# Altium schematic symbol library altera.SCHLIB: 68 symbols (part 5 of 6) (continued)
## EPF6016-P208
designator IC?, comment EPF6016   FLEX 6000 family
MPN: EPF6016AQC208-3N; OC_FARNELL: 1549398; OC_NEWARK: 51R9156
footprint PQFP208
part A pins: 6 !CE, 24 GCLK1, 28 GCLK2, 46 MSEL, 77 !CONFIG, 80 !STATUS, 128 GCLK3, 132 GCLK4, 150 CONF_DONE, 181 DATA0, 184 DCLK
part B pins: 9 VCCIO (power)
part C pins: 27 VCCIO (power)
part D pins: 45 VCCIO (power)
part E pins: 63 VCCIO (power)
part F pins: 79 VCCIO (power)
part G pins: 96 VCCIO (power)
part H pins: 112 VCCIO (power)
part I pins: 131 VCCIO (power)
part J pins: 149 VCCIO (power)
part K pins: 166 VCCIO (power)
part L pins: 183 VCCIO (power)
part M pins: 200 VCCIO (power)
part N pins: 7 GND (power)
part O pins: 25 GND (power)
part P pins: 43 GND (power)
part Q pins: 62 GND (power)
part R pins: 78 GND (power)
part S pins: 95 GND (power)
part T pins: 110 GND (power)
part U pins: 129 GND (power)
part V pins: 147 GND (power)
part W pins: 165 GND (power)
part X pins: 182 GND (power)
part Y pins: 199 GND (power)
part Z pins: 1 IOA1, 2 IOA3, 3 IOA4, 153 IOA6, 154 IOA7, 155 IOA8, 156 IOA9, 157 IOA11, 158 IOA12, 159 IOA13, 160 IOA14, 205 IOA15, 206 IOA16, 207 IOA17, 208 IOA18
part 27 pins: 16 IOC1, 17 IOC2, 18 IOC3, 19 IOC4, 20 IOC5, 21 IOC6, 22 IOC7, 23 IOC8, 133 IOC10, 134 IOC11, 135 IOC12, 136 IOC13, 137 IOC14, 138 IOC16, 139 IOC17, 140 IOC18
part 28 pins: 29 IOD1, 30 IOD3, 31 IOD4, 32 IOD5, 33 IOD6, 34 IOD7, 35 IOD8, 36 IOD9, 120 IOD11, 121 IOD12, 122 IOD13, 123 IOD14, 124 IOD15, 125 IOD16, 126 IOD17, 127 IOD18
part 29 pins: 37 IOE2, 38 IOE3, 39 IOE4, 40 IOE5, 41 IOE6, 42 IOE7, 47 IOE9, 108 IOE11, 109 IOE12, 113 IOE13, 114 IOE14, 115 IOE15, 116 IOE16, 117 IOE17, 118 IOE18, 119 IOE19
part 30 pins: 48 IOF1, 49 IOF2, 50 IOF3, 51 IOF4, 52 IOF5, 53 IOF7, 54 IOF8, 55 IOF9, 56 IOF10, 101 IOF11, 102 IOF12, 103 IOF13, 104 IOF14, 105 IOF15, 106 IOF17, 107 IOF18
part 31 pins: 57 IO11, 58 IO21, 59 IO22, 60 IO31, 61 IO32, 64 IO41, 65 IO51, 66 IO52, 195 IO53, 196 IO54, 197 IO43, 198 IO44, 201 IO34, 202 IO23, 203 IO24, 204 IO12
part 32 pins: 67 IO61, 68 IO71, 69 IO72, 70 IO81, 71 IO82, 72 IO91, 188 IO93, 189 IO94, 190 IO83, 191 IO73, 192 IO74, 193 IO63, 194 IO64
part 33 pins: 73 IO101, 74 IO102, 75 IO111, 76 IO112, 81 IO121, 82 IO122, 83 IO132, 178 IO133, 179 IO134, 180 IO123, 185 IO113, 186 IO114, 187 IO104
part 34 pins: 84 IO141, 85 IO142, 86 IO151, 87 IO152, 88 IO161, 89 IO162, 90 IO172, 171 IO173, 172 IO174, 173 IO163, 174 IO164, 175 IO153, 176 IO154, 177 IO143
part 35 pins: 91 IO181, 92 IO182, 93 IO191, 94 IO192, 97 IO202, 98 IO211, 99 IO212, 100 IO221, 161 IO222, 162 IO214, 163 IO203, 164 IO204, 167 IO193, 168 IO194, 169 IO183, 170 IO184
part 36 pins: 4 IOB1, 5 IOB2, 10 IOB4, 11 IOB5, 12 IOB6, 13 IOB7, 14 IOB8, 15 IOB9, 141 IOB10, 142 IOB11, 143 IOB12, 144 IOB14, 145 IOB15, 146 IOB16, 151 IOB17, 152 IOB18
part 37 pins: 8 VCC (power)
part 38 pins: 26 VCC (power)
part 39 pins: 44 VCC (power)
part 40 pins: 111 VCC (power)
part 41 pins: 130 VCC (power)
part 42 pins: 148 VCC (power)

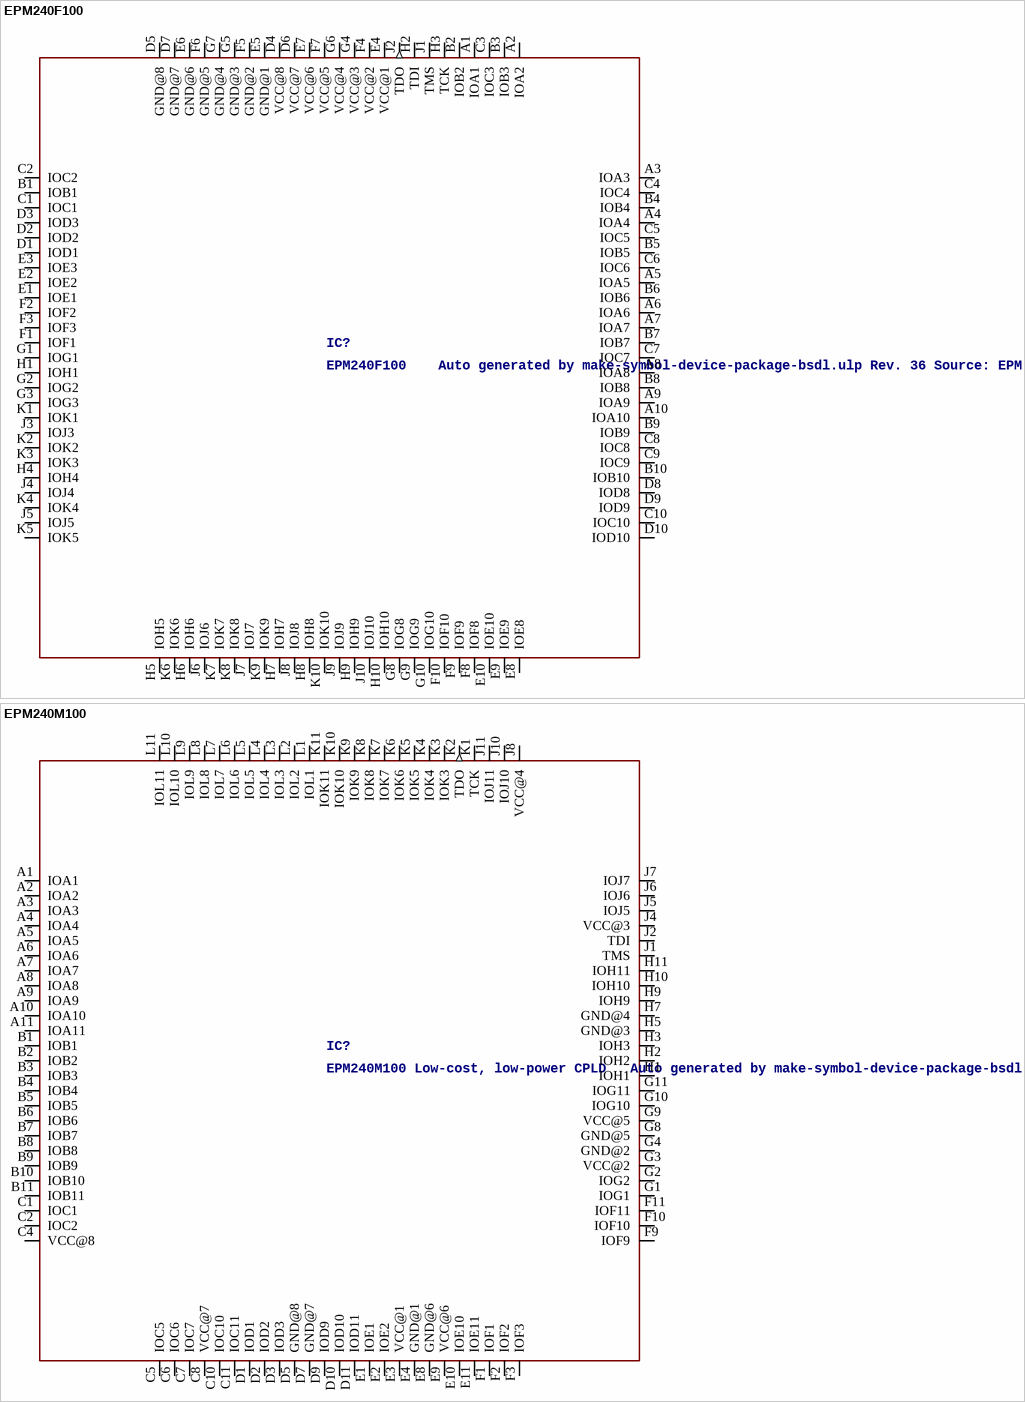
[diagram p39: symbols EPM240F100 to EPM240M100]

## EPM240F100
designator IC?, comment EPM240F100    Auto generated by make-symbol-device-package-bsdl.ulp Rev. 36 Source: EPM240F100.BSD
MPN: SA800-B293; OC_FARNELL: 1635094; OC_NEWARK: 74R0178
footprint FBGA100
pins: A1 IOA1, A2 IOA2, A3 IOA3, A4 IOA4, A5 IOA5, A6 IOA6, A7 IOA7, A8 IOA8, A9 IOA9, A10 IOA10, B1 IOB1, B2 IOB2, B3 IOB3, B4 IOB4, B5 IOB5, B6 IOB6, B7 IOB7, B8 IOB8, B9 IOB9, B10 IOB10, C1 IOC1, C2 IOC2, C3 IOC3, C4 IOC4, C5 IOC5, C6 IOC6, C7 IOC7, C8 IOC8, C9 IOC9, C10 IOC10, D1 IOD1, D2 IOD2, D3 IOD3, D4 VCC@8 (power), D5 GND@8 (power), D6 VCC@7 (power), D7 GND@7 (power), D8 IOD8, D9 IOD9, D10 IOD10, E1 IOE1, E2 IOE2, E3 IOE3, E4 VCC@1 (power), E5 GND@1 (power), E6 GND@6 (power), E7 VCC@6 (power), E8 IOE8, E9 IOE9, E10 IOE10, F1 IOF1, F2 IOF2, F3 IOF3, F4 VCC@2 (power), F5 GND@2 (power), F6 GND@5 (power), F7 VCC@5 (power), F8 IOF8, F9 IOF9, F10 IOF10, G1 IOG1, G2 IOG2, G3 IOG3, G4 VCC@3 (power), G5 GND@3 (power), G6 VCC@4 (power), G7 GND@4 (power), G8 IOG8, G9 IOG9, G10 IOG10, H1 IOH1, H2 TDI, H3 TCK, H4 IOH4, H5 IOH5, H6 IOH6, H7 IOH7, H8 IOH8, H9 IOH9, H10 IOH10, J1 TMS, J2 TDO (out), J3 IOJ3, J4 IOJ4, J5 IOJ5, J6 IOJ6, J7 IOJ7, J8 IOJ8, J9 IOJ9, J10 IOJ10, K1 IOK1, K2 IOK2, K3 IOK3, K4 IOK4, K5 IOK5, K6 IOK6, K7 IOK7, K8 IOK8, K9 IOK9, K10 IOK10

## EPM240M100
designator IC?, comment EPM240M100 Low-cost, low-power CPLD   Auto generated by make-symbol-device-package-bsdl.ulp Rev. 36 Source: EPM240M100.BSD
MPN: EPM240M100C4N; OC_FARNELL: 1635095; OC_NEWARK: 51R0493
footprint MBGA100
pins: A1 IOA1, A2 IOA2, A3 IOA3, A4 IOA4, A5 IOA5, A6 IOA6, A7 IOA7, A8 IOA8, A9 IOA9, A10 IOA10, A11 IOA11, B1 IOB1, B2 IOB2, B3 IOB3, B4 IOB4, B5 IOB5, B6 IOB6, B7 IOB7, B8 IOB8, B9 IOB9, B10 IOB10, B11 IOB11, C1 IOC1, C2 IOC2, C4 VCC@8 (power), C5 IOC5, C6 IOC6, C7 IOC7, C8 VCC@7 (power), C10 IOC10, C11 IOC11, D1 IOD1, D2 IOD2, D3 IOD3, D5 GND@8 (power), D7 GND@7 (power), D9 IOD9, D10 IOD10, D11 IOD11, E1 IOE1, E2 IOE2, E3 VCC@1 (power), E4 GND@1 (power), E8 GND@6 (power), E9 VCC@6 (power), E10 IOE10, E11 IOE11, F1 IOF1, F2 IOF2, F3 IOF3, F9 IOF9, F10 IOF10, F11 IOF11, G1 IOG1, G2 IOG2, G3 VCC@2 (power), G4 GND@2 (power), G8 GND@5 (power), G9 VCC@5 (power), G10 IOG10, G11 IOG11, H1 IOH1, H2 IOH2, H3 IOH3, H5 GND@3 (power), H7 GND@4 (power), H9 IOH9, H10 IOH10, H11 IOH11, J1 TMS, J2 TDI, J4 VCC@3 (power), J5 IOJ5, J6 IOJ6, J7 IOJ7, J8 VCC@4 (power), J10 IOJ10, J11 IOJ11, K1 TCK, K2 TDO (out), K3 IOK3, K4 IOK4, K5 IOK5, K6 IOK6, K7 IOK7, K8 IOK8, K9 IOK9, K10 IOK10, K11 IOK11, L1 IOL1, L2 IOL2, L3 IOL3, L4 IOL4, L5 IOL5, L6 IOL6, L7 IOL7, L8 IOL8, L9 IOL9, L10 IOL10, L11 IOL11

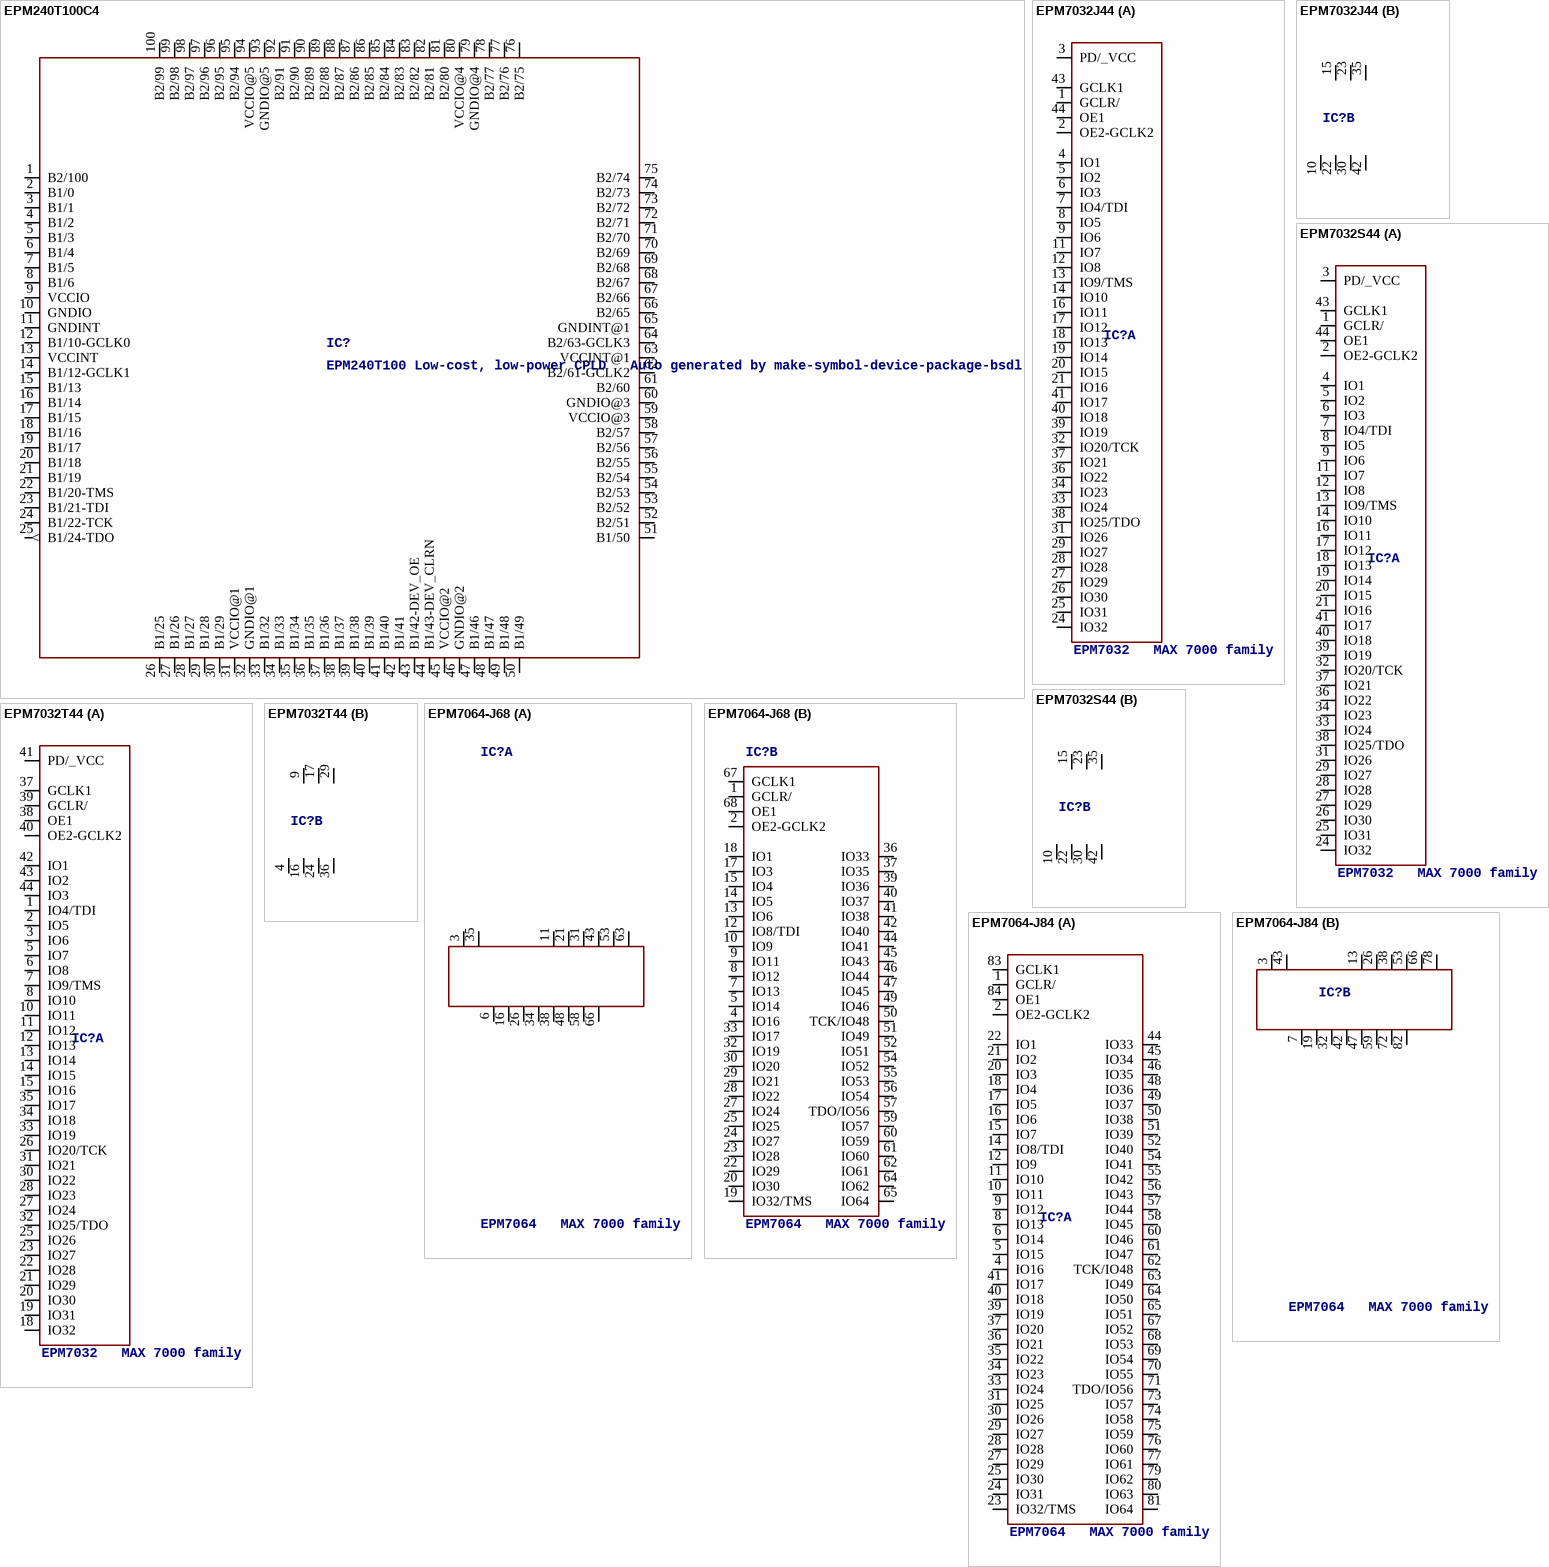
[diagram p40: symbols EPM240T100C4 to EPM7064-J84]

## EPM240T100C4
designator IC?, comment EPM240T100 Low-cost, low-power CPLD   Auto generated by make-symbol-device-package-bsdl.ulp Rev. 35 Source: www.altera.com .. epm240-io.txt
MPN: EPM240T100C4; OC_FARNELL: 1453502; OC_NEWARK: 51R9357
footprint TQFP100
pins: 1 B2/100, 2 B1/0, 3 B1/1, 4 B1/2, 5 B1/3, 6 B1/4, 7 B1/5, 8 B1/6, 9 VCCIO (power), 10 GNDIO (power), 11 GNDINT (power), 12 B1/10-GCLK0, 13 VCCINT (power), 14 B1/12-GCLK1, 15 B1/13, 16 B1/14, 17 B1/15, 18 B1/16, 19 B1/17, 20 B1/18, 21 B1/19, 22 B1/20-TMS, 23 B1/21-TDI, 24 B1/22-TCK, 25 B1/24-TDO (out), 26 B1/25, 27 B1/26, 28 B1/27, 29 B1/28, 30 B1/29, 31 VCCIO@1 (power), 32 GNDIO@1 (power), 33 B1/32, 34 B1/33, 35 B1/34, 36 B1/35, 37 B1/36, 38 B1/37, 39 B1/38, 40 B1/39, 41 B1/40, 42 B1/41, 43 B1/42-DEV_OE, 44 B1/43-DEV_CLRN, 45 VCCIO@2 (power), 46 GNDIO@2 (power), 47 B1/46, 48 B1/47, 49 B1/48, 50 B1/49, 51 B1/50, 52 B2/51, 53 B2/52, 54 B2/53, 55 B2/54, 56 B2/55, 57 B2/56, 58 B2/57, 59 VCCIO@3 (power), 60 GNDIO@3 (power), 61 B2/60, 62 B2/61-GCLK2, 63 VCCINT@1 (power), 64 B2/63-GCLK3, 65 GNDINT@1 (power), 66 B2/65, 67 B2/66, 68 B2/67, 69 B2/68, 70 B2/69, 71 B2/70, 72 B2/71, 73 B2/72, 74 B2/73, 75 B2/74, 76 B2/75, 77 B2/76, 78 B2/77, 79 GNDIO@4 (power), 80 VCCIO@4 (power), 81 B2/80, 82 B2/81, 83 B2/82, 84 B2/83, 85 B2/84, 86 B2/85, 87 B2/86, 88 B2/87, 89 B2/88, 90 B2/89, 91 B2/90, 92 B2/91, 93 GNDIO@5 (power), 94 VCCIO@5 (power), 95 B2/94, 96 B2/95, 97 B2/96, 98 B2/97, 99 B2/98, 100 B2/99

## EPM7032J44
designator IC?, comment EPM7032   MAX 7000 family
OC_FARNELL: unknown; OC_NEWARK: unknown
footprint PLCC44
part A pins: 1 GCLR/, 2 OE2-GCLK2, 3 PD/_VCC, 4 IO1, 5 IO2, 6 IO3, 7 IO4/TDI, 8 IO5, 9 IO6, 11 IO7, 12 IO8, 13 IO9/TMS, 14 IO10, 16 IO11, 17 IO12, 18 IO13, 19 IO14, 20 IO15, 21 IO16, 24 IO32, 25 IO31, 26 IO30, 27 IO29, 28 IO28, 29 IO27, 31 IO26, 32 IO20/TCK, 33 IO24, 34 IO23, 36 IO22, 37 IO21, 38 IO25/TDO, 39 IO19, 40 IO18, 41 IO17, 43 GCLK1, 44 OE1
part B pins: 10 GND (power), 15 VCC (power), 22 GND@1 (power), 23 VCC@1 (power), 30 GND@2 (power), 35 VCC@2 (power), 42 GND@3 (power)

## EPM7032S44
designator IC?, comment EPM7032   MAX 7000 family
MPN: EPM7032SLC44-6N; OC_FARNELL: 1549447; OC_NEWARK: 51R9532
footprint PLCC-S44
part A pins: 1 GCLR/, 2 OE2-GCLK2, 3 PD/_VCC, 4 IO1, 5 IO2, 6 IO3, 7 IO4/TDI, 8 IO5, 9 IO6, 11 IO7, 12 IO8, 13 IO9/TMS, 14 IO10, 16 IO11, 17 IO12, 18 IO13, 19 IO14, 20 IO15, 21 IO16, 24 IO32, 25 IO31, 26 IO30, 27 IO29, 28 IO28, 29 IO27, 31 IO26, 32 IO20/TCK, 33 IO24, 34 IO23, 36 IO22, 37 IO21, 38 IO25/TDO, 39 IO19, 40 IO18, 41 IO17, 43 GCLK1, 44 OE1
part B pins: 10 GND (power), 15 VCC (power), 22 GND@1 (power), 23 VCC@1 (power), 30 GND@2 (power), 35 VCC@2 (power), 42 GND@3 (power)

## EPM7032T44
designator IC?, comment EPM7032   MAX 7000 family
MPN: EPM7032SLC44-6N; OC_FARNELL: 1549447; OC_NEWARK: 51R9532
footprint TQFP44
part A pins: 1 IO4/TDI, 2 IO5, 3 IO6, 5 IO7, 6 IO8, 7 IO9/TMS, 8 IO10, 10 IO11, 11 IO12, 12 IO13, 13 IO14, 14 IO15, 15 IO16, 18 IO32, 19 IO31, 20 IO30, 21 IO29, 22 IO28, 23 IO27, 25 IO26, 26 IO20/TCK, 27 IO24, 28 IO23, 30 IO22, 31 IO21, 32 IO25/TDO, 33 IO19, 34 IO18, 35 IO17, 37 GCLK1, 38 OE1, 39 GCLR/, 40 OE2-GCLK2, 41 PD/_VCC, 42 IO1, 43 IO2, 44 IO3
part B pins: 4 GND (power), 9 VCC (power), 16 GND@1 (power), 17 VCC@1 (power), 24 GND@2 (power), 29 VCC@2 (power), 36 GND@3 (power)

## EPM7064-J68
designator IC?, comment EPM7064   MAX 7000 family
OC_FARNELL: unknown; OC_NEWARK: unknown
footprint PLCC68
part A pins: 3 VCC (power), 6 GND (power), 11 VCCIO (power), 16 GND@1 (power), 21 VCCIO@1 (power), 26 GND@2 (power), 31 VCCIO@2 (power), 34 GND@3 (power), 35 VCC@1 (power), 38 GND@4 (power), 43 VCCIO@3 (power), 48 GND@5 (power), 53 VCCIO@4 (power), 58 GND@6 (power), 63 VCCIO@5 (power), 66 GND@7 (power)
part B pins: 1 GCLR/, 2 OE2-GCLK2, 4 IO16, 5 IO14, 7 IO13, 8 IO12, 9 IO11, 10 IO9, 12 IO8/TDI, 13 IO6, 14 IO5, 15 IO4, 17 IO3, 18 IO1, 19 IO32/TMS, 20 IO30, 22 IO29, 23 IO28, 24 IO27, 25 IO25, 27 IO24, 28 IO22, 29 IO21, 30 IO20, 32 IO19, 33 IO17, 36 IO33, 37 IO35, 39 IO36, 40 IO37, 41 IO38, 42 IO40, 44 IO41, 45 IO43, 46 IO44, 47 IO45, 49 IO46, 50 TCK/IO48, 51 IO49, 52 IO51, 54 IO52, 55 IO53, 56 IO54, 57 TDO/IO56, 59 IO57, 60 IO59, 61 IO60, 62 IO61, 64 IO62, 65 IO64, 67 GCLK1, 68 OE1

## EPM7064-J84
designator IC?, comment EPM7064   MAX 7000 family
MPN: EPM7064SLC84-10N; OC_FARNELL: 1549457; OC_NEWARK: 51R9623
footprint PLCC84
part A pins: 1 GCLR/, 2 OE2-GCLK2, 4 IO16, 5 IO15, 6 IO14, 8 IO13, 9 IO12, 10 IO11, 11 IO10, 12 IO9, 14 IO8/TDI, 15 IO7, 16 IO6, 17 IO5, 18 IO4, 20 IO3, 21 IO2, 22 IO1, 23 IO32/TMS, 24 IO31, 25 IO30, 27 IO29, 28 IO28, 29 IO27, 30 IO26, 31 IO25, 33 IO24, 34 IO23, 35 IO22, 36 IO21, 37 IO20, 39 IO19, 40 IO18, 41 IO17, 44 IO33, 45 IO34, 46 IO35, 48 IO36, 49 IO37, 50 IO38, 51 IO39, 52 IO40, 54 IO41, 55 IO42, 56 IO43, 57 IO44, 58 IO45, 60 IO46, 61 IO47, 62 TCK/IO48, 63 IO49, 64 IO50, 65 IO51, 67 IO52, 68 IO53, 69 IO54, 70 IO55, 71 TDO/IO56, 73 IO57, 74 IO58, 75 IO59, 76 IO60, 77 IO61, 79 IO62, 80 IO63, 81 IO64, 83 GCLK1, 84 OE1
part B pins: 3 VCC (power), 7 GND (power), 13 VCCIO (power), 19 GND@1 (power), 26 VCCIO@1 (power), 32 GND@2 (power), 38 VCCIO@2 (power), 42 GND@3 (power), 43 VCC@1 (power), 47 GND@4 (power), 53 VCCIO@3 (power), 59 GND@5 (power), 66 VCCIO@4 (power), 72 GND@6 (power), 78 VCCIO@5 (power), 82 GND@7 (power)

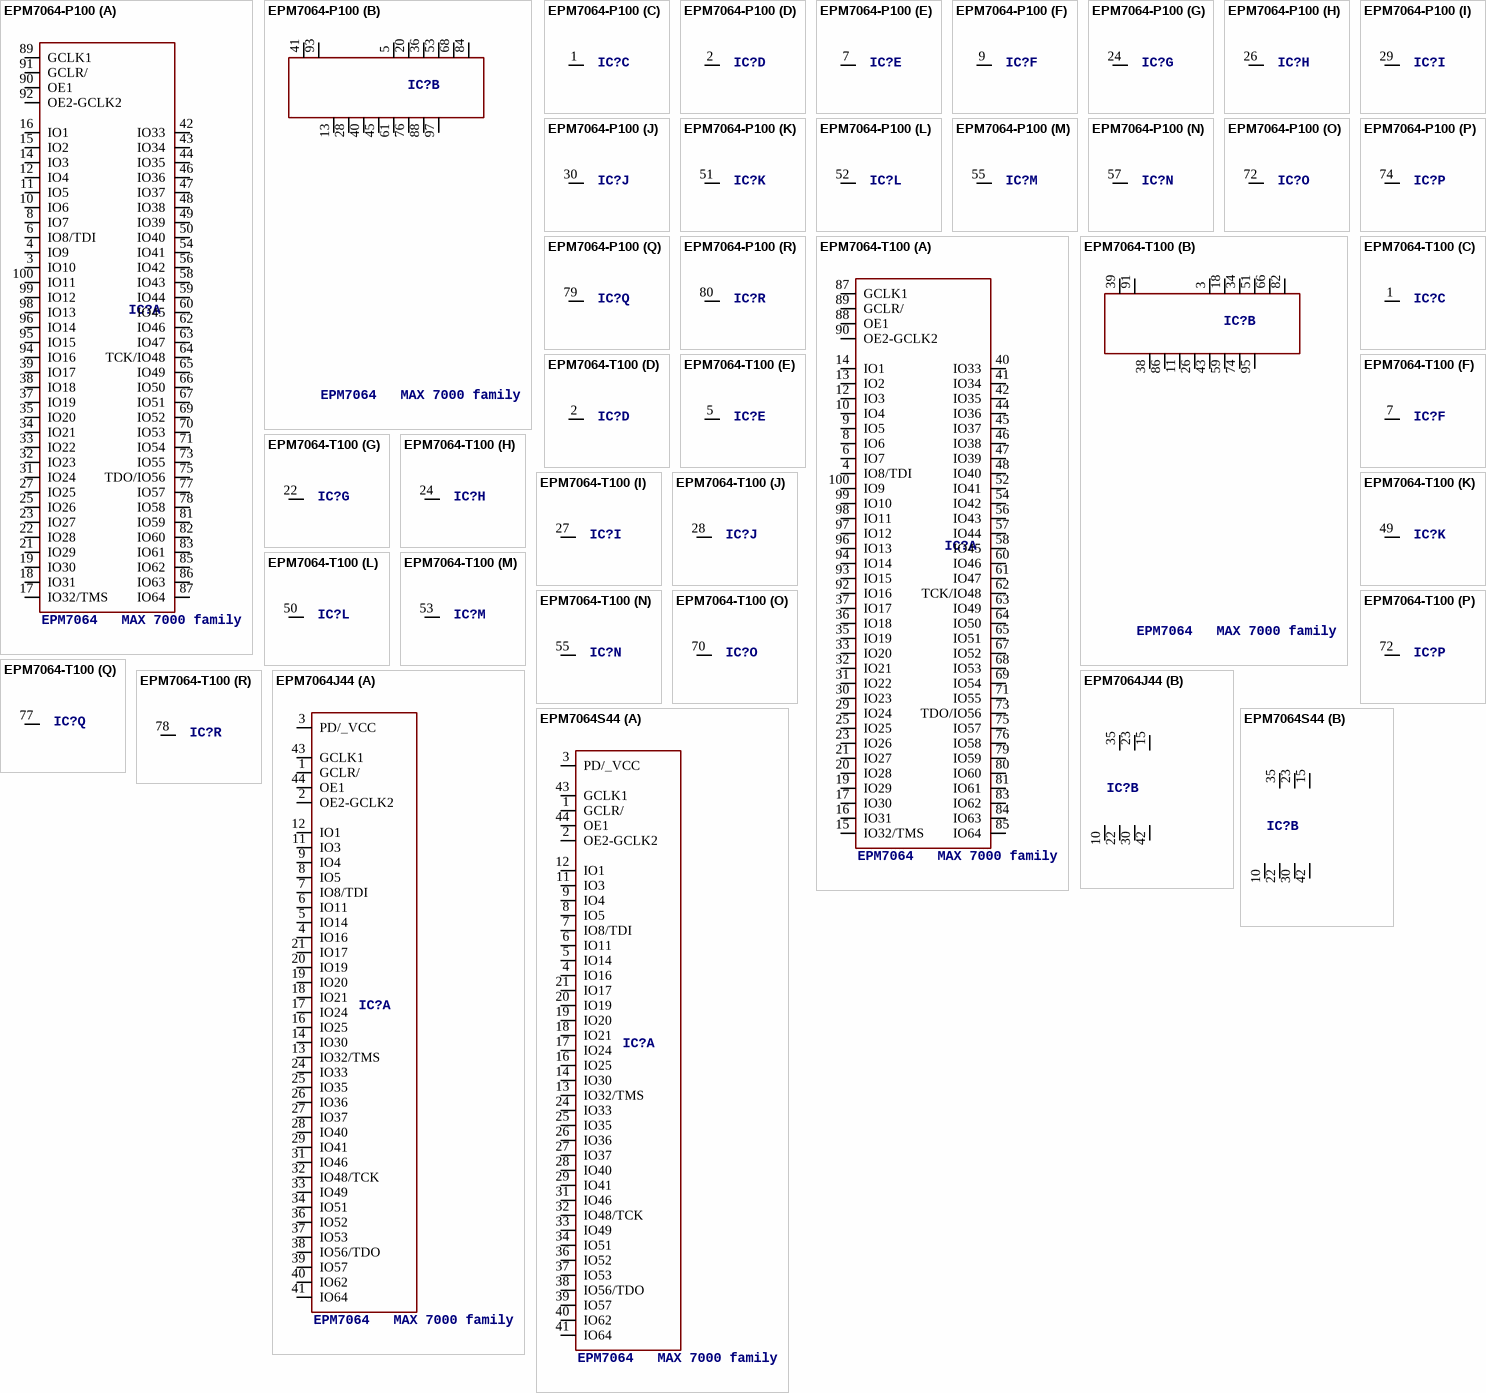
[diagram p41: symbols EPM7064-P100 to EPM7064S44]

## EPM7064-P100
designator IC?, comment EPM7064   MAX 7000 family
MPN: EPM7064STI100-7N; OC_FARNELL: 1549426; OC_NEWARK: 51R9650
footprint PQFP100
part A pins: 3 IO10, 4 IO9, 6 IO8/TDI, 8 IO7, 10 IO6, 11 IO5, 12 IO4, 14 IO3, 15 IO2, 16 IO1, 17 IO32/TMS, 18 IO31, 19 IO30, 21 IO29, 22 IO28, 23 IO27, 25 IO26, 27 IO25, 31 IO24, 32 IO23, 33 IO22, 34 IO21, 35 IO20, 37 IO19, 38 IO18, 39 IO17, 42 IO33, 43 IO34, 44 IO35, 46 IO36, 47 IO37, 48 IO38, 49 IO39, 50 IO40, 54 IO41, 56 IO42, 58 IO43, 59 IO44, 60 IO45, 62 IO46, 63 IO47, 64 TCK/IO48, 65 IO49, 66 IO50, 67 IO51, 69 IO52, 70 IO53, 71 IO54, 73 IO55, 75 TDO/IO56, 77 IO57, 78 IO58, 81 IO59, 82 IO60, 83 IO61, 85 IO62, 86 IO63, 87 IO64, 89 GCLK1, 90 OE1, 91 GCLR/, 92 OE2-GCLK2, 94 IO16, 95 IO15, 96 IO14, 98 IO13, 99 IO12, 100 IO11
part B pins: 5 VCCIO (power), 13 GND (power), 20 VCCIO@1 (power), 28 GND@1 (power), 36 VCCIO@2 (power), 40 GND@2 (power), 41 VCC (power), 45 GND@3 (power), 53 VCCIO@3 (power), 61 GND@4 (power), 68 VCCIO@4 (power), 76 GND@5 (power), 84 VCCIO@5 (power), 88 GND@6 (power), 93 VCC@1 (power), 97 GND@7 (power)
part C pins: 1 NC
part D pins: 2 NC
part E pins: 7 NC
part F pins: 9 NC
part G pins: 24 NC
part H pins: 26 NC
part I pins: 29 NC
part J pins: 30 NC
part K pins: 51 NC
part L pins: 52 NC
part M pins: 55 NC
part N pins: 57 NC
part O pins: 72 NC
part P pins: 74 NC
part Q pins: 79 NC
part R pins: 80 NC

## EPM7064-T100
designator IC?, comment EPM7064   MAX 7000 family
MPN: EPM7064STI100-7N; OC_FARNELL: 1549426; OC_NEWARK: 51R9650
footprint TQFP100
part A pins: 4 IO8/TDI, 6 IO7, 8 IO6, 9 IO5, 10 IO4, 12 IO3, 13 IO2, 14 IO1, 15 IO32/TMS, 16 IO31, 17 IO30, 19 IO29, 20 IO28, 21 IO27, 23 IO26, 25 IO25, 29 IO24, 30 IO23, 31 IO22, 32 IO21, 33 IO20, 35 IO19, 36 IO18, 37 IO17, 40 IO33, 41 IO34, 42 IO35, 44 IO36, 45 IO37, 46 IO38, 47 IO39, 48 IO40, 52 IO41, 54 IO42, 56 IO43, 57 IO44, 58 IO45, 60 IO46, 61 IO47, 62 TCK/IO48, 63 IO49, 64 IO50, 65 IO51, 67 IO52, 68 IO53, 69 IO54, 71 IO55, 73 TDO/IO56, 75 IO57, 76 IO58, 79 IO59, 80 IO60, 81 IO61, 83 IO62, 84 IO63, 85 IO64, 87 GCLK1, 88 OE1, 89 GCLR/, 90 OE2-GCLK2, 92 IO16, 93 IO15, 94 IO14, 96 IO13, 97 IO12, 98 IO11, 99 IO10, 100 IO9
part B pins: 3 VCCIO (power), 11 GND@2 (power), 18 VCCIO@1 (power), 26 GND@3 (power), 34 VCCIO@2 (power), 38 GND (power), 39 VCC (power), 43 GND@4 (power), 51 VCCIO@3 (power), 59 GND@5 (power), 66 VCCIO@4 (power), 74 GND@6 (power), 82 VCCIO@5 (power), 86 GND@1 (power), 91 VCC@1 (power), 95 GND@7 (power)
part C pins: 1 NC
part D pins: 2 NC
part E pins: 5 NC
part F pins: 7 NC
part G pins: 22 NC
part H pins: 24 NC
part I pins: 27 NC
part J pins: 28 NC
part K pins: 49 NC
part L pins: 50 NC
part M pins: 53 NC
part N pins: 55 NC
part O pins: 70 NC
part P pins: 72 NC
part Q pins: 77 NC
part R pins: 78 NC

## EPM7064J44
designator IC?, comment EPM7064   MAX 7000 family
OC_FARNELL: unknown; OC_NEWARK: unknown
footprint PLCC44
part A pins: 1 GCLR/, 2 OE2-GCLK2, 3 PD/_VCC, 4 IO16, 5 IO14, 6 IO11, 7 IO8/TDI, 8 IO5, 9 IO4, 11 IO3, 12 IO1, 13 IO32/TMS, 14 IO30, 16 IO25, 17 IO24, 18 IO21, 19 IO20, 20 IO19, 21 IO17, 24 IO33, 25 IO35, 26 IO36, 27 IO37, 28 IO40, 29 IO41, 31 IO46, 32 IO48/TCK, 33 IO49, 34 IO51, 36 IO52, 37 IO53, 38 IO56/TDO, 39 IO57, 40 IO62, 41 IO64, 43 GCLK1, 44 OE1
part B pins: 10 GND (power), 15 VCC@2 (power), 22 GND@1 (power), 23 VCC@1 (power), 30 GND@2 (power), 35 VCC (power), 42 GND@3 (power)

## EPM7064S44
designator IC?, comment EPM7064   MAX 7000 family
MPN: EPM7064SLC44-10N; OC_FARNELL: 1549449; OC_NEWARK: 51R0526
footprint PLCC-S44
part A pins: 1 GCLR/, 2 OE2-GCLK2, 3 PD/_VCC, 4 IO16, 5 IO14, 6 IO11, 7 IO8/TDI, 8 IO5, 9 IO4, 11 IO3, 12 IO1, 13 IO32/TMS, 14 IO30, 16 IO25, 17 IO24, 18 IO21, 19 IO20, 20 IO19, 21 IO17, 24 IO33, 25 IO35, 26 IO36, 27 IO37, 28 IO40, 29 IO41, 31 IO46, 32 IO48/TCK, 33 IO49, 34 IO51, 36 IO52, 37 IO53, 38 IO56/TDO, 39 IO57, 40 IO62, 41 IO64, 43 GCLK1, 44 OE1
part B pins: 10 GND (power), 15 VCC@2 (power), 22 GND@1 (power), 23 VCC@1 (power), 30 GND@2 (power), 35 VCC (power), 42 GND@3 (power)

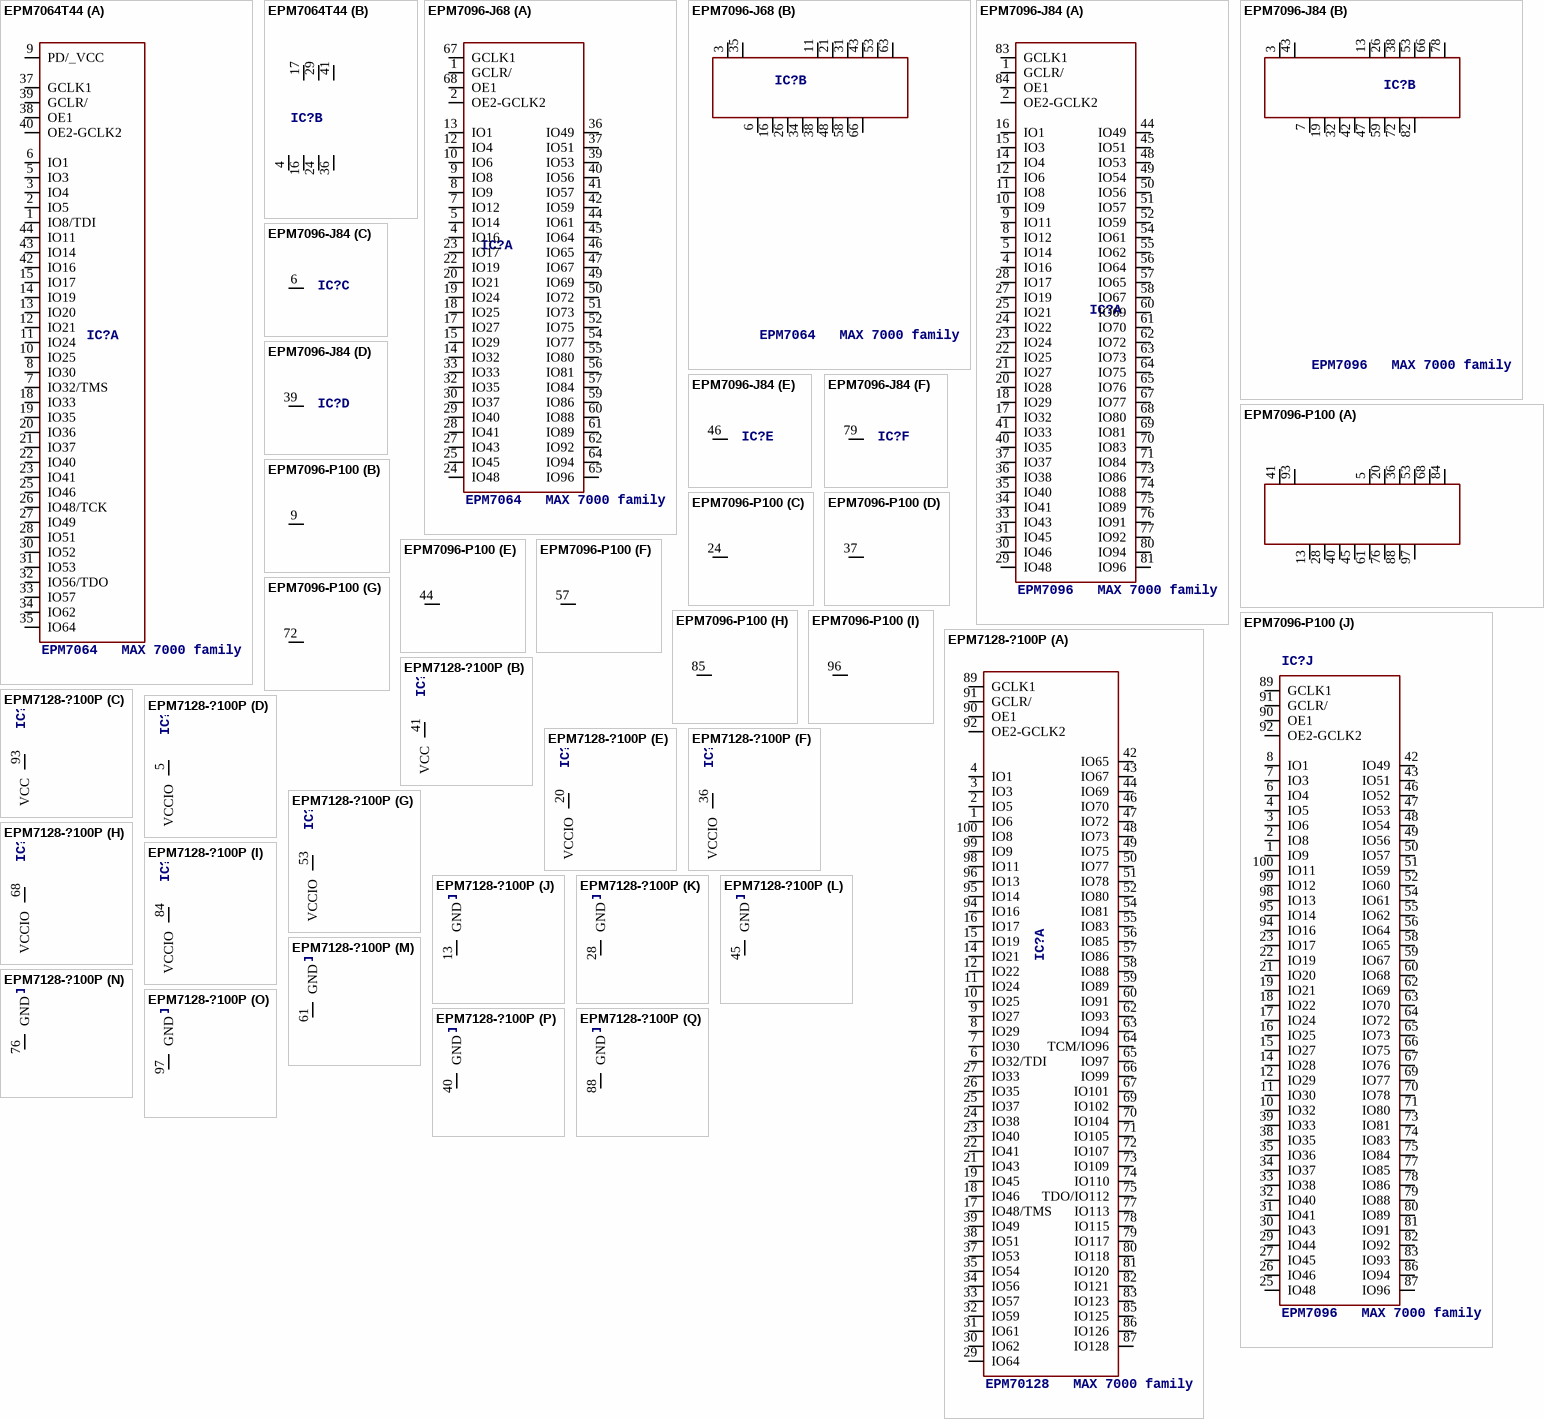
[diagram p42: symbols EPM7064T44 to EPM7128-?100P]

## EPM7064T44
designator IC?, comment EPM7064   MAX 7000 family
MPN: EPM7064TC44-15; OC_FARNELL: unknown; OC_NEWARK: 51R9653
footprint TQFP44
part A pins: 1 IO8/TDI, 2 IO5, 3 IO4, 5 IO3, 6 IO1, 7 IO32/TMS, 8 IO30, 9 PD/_VCC, 10 IO25, 11 IO24, 12 IO21, 13 IO20, 14 IO19, 15 IO17, 18 IO33, 19 IO35, 20 IO36, 21 IO37, 22 IO40, 23 IO41, 25 IO46, 26 IO48/TCK, 27 IO49, 28 IO51, 30 IO52, 31 IO53, 32 IO56/TDO, 33 IO57, 34 IO62, 35 IO64, 37 GCLK1, 38 OE1, 39 GCLR/, 40 OE2-GCLK2, 42 IO16, 43 IO14, 44 IO11
part B pins: 4 GND (power), 16 GND@1 (power), 17 VCC (power), 24 GND@2 (power), 29 VCC@1 (power), 36 GND@3 (power), 41 VCC@2 (power)

## EPM7096-J68
designator IC?, comment EPM7064   MAX 7000 family
MPN: EPM7096LC68-10; OC_FARNELL: unknown; OC_NEWARK: 51R9655
footprint PLCC68
part A pins: 1 GCLR/, 2 OE2-GCLK2, 4 IO16, 5 IO14, 7 IO12, 8 IO9, 9 IO8, 10 IO6, 12 IO4, 13 IO1, 14 IO32, 15 IO29, 17 IO27, 18 IO25, 19 IO24, 20 IO21, 22 IO19, 23 IO17, 24 IO48, 25 IO45, 27 IO43, 28 IO41, 29 IO40, 30 IO37, 32 IO35, 33 IO33, 36 IO49, 37 IO51, 39 IO53, 40 IO56, 41 IO57, 42 IO59, 44 IO61, 45 IO64, 46 IO65, 47 IO67, 49 IO69, 50 IO72, 51 IO73, 52 IO75, 54 IO77, 55 IO80, 56 IO81, 57 IO84, 59 IO86, 60 IO88, 61 IO89, 62 IO92, 64 IO94, 65 IO96, 67 GCLK1, 68 OE1
part B pins: 3 VCC (power), 6 GND (power), 11 VCCIO (power), 16 GND@1 (power), 21 VCCIO@1 (power), 26 GND@2 (power), 31 VCCIO@2 (power), 34 GND@3 (power), 35 VCC@1 (power), 38 GND@4 (power), 43 VCCIO@3 (power), 48 GND@5 (power), 53 VCCIO@4 (power), 58 GND@6 (power), 63 VCCIO@5 (power), 66 GND@7 (power)
